# Altium footprint library DBLib.PcbLib: 92 footprints (part 3 of 6)
Each footprint in its own frame and in the unit in brackets; x right, y up, seen from the top. Pads: shape width x height; smd on the part's side, far side on the other; paste and mask are expansions set on the pad; w line width, h text height; cw(c..) or ccw(c..) is an arc to the next point about the centre after c.
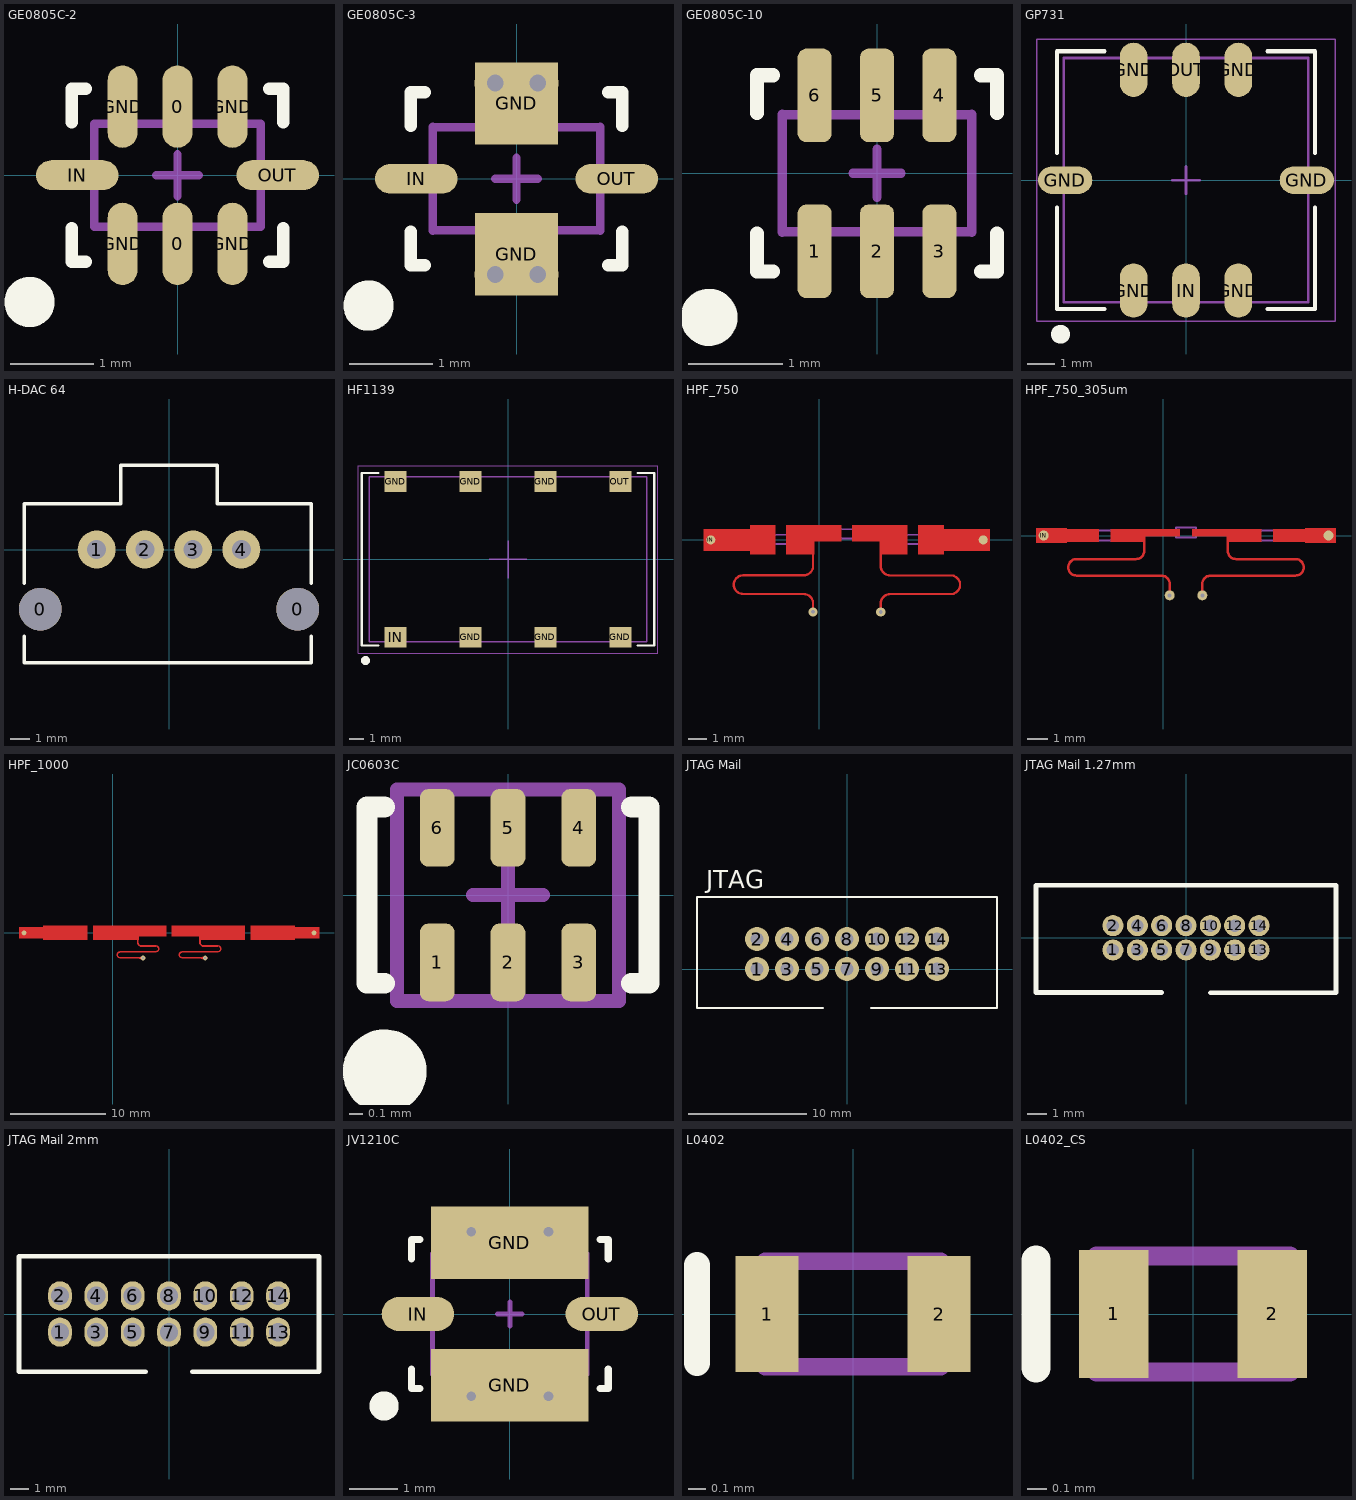
[diagram p2: the footprints below, top view; thin cyan lines are the x and y axes]

## GE0805C-2 [mm] "Low Pass Filter"
height 0.94
pads (8):
  oval 0.36x0.99 smd: 0(0,-0.825) 0(0,0.825) GND(-0.66,-0.825) GND(-0.66,0.825) GND(0.66,-0.825) GND(0.66,0.825)
  oval 0.99x0.36 smd: IN(-1.205,0) OUT(1.205,0)
Top Overlay:
  circle w0.35: c-1.778,-1.524 r0.127
  lines w0.15: -1.27,-0.638 -1.27,-1.038 -1.101,-1.038 ; -1.27,0.638 -1.27,1.038 -1.101,1.038 ; 1.101,-1.038 1.27,-1.038 1.27,-0.638 ; 1.101,1.038 1.27,1.038 1.27,0.638
Mechanical 1:
  lines w0.1: -0.254,0 0.254,0 ; 0,-0.254 0,0.254 ; -1,-0.62 1,-0.62 1,0.62 -1,0.62 -1,-0.62
3D body "User Library-Balun2450FB15L0001.step": height 0.8, standoff 0, extent -1,-0.625 1,0.625

## GE0805C-3 [mm] "Bandpass Filter"
height 0.94
pads (4):
  rect 1x0.99 smd: GND(0,-0.905) GND(0,0.905)
  oval 0.99x0.36 smd: IN(-1.205,0) OUT(1.205,0)
via -0.254,1.15 diameter 0.5 hole 0.2
via 0.254,1.15 diameter 0.5 hole 0.2
via -0.254,-1.15 diameter 0.5 hole 0.2
via 0.254,-1.15 diameter 0.5 hole 0.2
Top Overlay:
  circle w0.35: c-1.778,-1.524 r0.127
  lines w0.15: -1.27,-0.638 -1.27,-1.038 -1.101,-1.038 ; -1.27,0.638 -1.27,1.038 -1.101,1.038 ; 1.101,-1.038 1.27,-1.038 1.27,-0.638 ; 1.101,1.038 1.27,1.038 1.27,0.638
Mechanical 1:
  lines w0.1: -1.005,-0.625 -1.005,0.625 ; -1.005,-0.62 1,-0.62 ; -1.005,0.62 1,0.62 ; -0.254,0 0.254,0 ; 0,-0.254 0,0.254 ; 1.005,-0.625 1.005,0.625
3D body "User Library-3600BP15M600.step": height 0.93, standoff -0.03, extent -1.001,-0.626 1.001,0.626

## GE0805C-10 [mm] "Diplexer"
height 0.94
pads (6):
  rrect50% 0.36x0.99 smd: 1(-0.66,-0.825) 2(0,-0.825) 3(0.66,-0.825) 4(0.66,0.825) 5(0,0.825) 6(-0.66,0.825)
Top Overlay:
  circle w0.35: c-1.778,-1.524 r0.127
  lines w0.15: -1.27,-0.638 -1.27,-1.038 -1.101,-1.038 ; -1.27,0.638 -1.27,1.038 -1.101,1.038 ; 1.101,-1.038 1.27,-1.038 1.27,-0.638 ; 1.101,1.038 1.27,1.038 1.27,0.638
Mechanical 1:
  lines w0.1: -1.005,-0.625 -1.005,0.625 ; -1.005,-0.62 1,-0.62 ; -1.005,0.62 1,0.62 ; -0.254,0 0.254,0 ; 0,-0.254 0,0.254 ; 1.005,-0.625 1.005,0.625
3D body "User Library-Balun2450FB15L0001.step": height 0.8, standoff 0, extent -1,-0.625 1,0.625

## GP731 [mm] "Low Pass Filter"
height 2.54
pads (8):
  oval 2x1.02 smd: GND(-4.451,0) GND(4.451,0)
  oval 1.02x2 smd: GND(-1.93,-4.065) GND(-1.93,4.065) GND(1.93,-4.065) GND(1.93,4.065) IN(0,-4.065) OUT(0,4.065)
Top Overlay:
  circle w0.35: c-4.625,-5.675 r0.175
  lines w0.15: -4.75,-1 -4.75,-4.75 -3,-4.75 ; -4.75,1 -4.75,4.75 -3,4.75 ; 3,-4.75 4.75,-4.75 4.75,-1 ; 3,4.75 4.75,4.75 4.75,1
Mechanical 1:
  lines w0.05: -5.5,-5.2 -5.5,5.2 5.5,5.2 5.5,-5.2 -5.5,-5.2
  lines w0.1: -0.5,0 0.5,0 ; 0,-0.5 0,0.5 ; -4.5,-4.5 -4.5,4.5 4.5,4.5 4.5,-4.5 -4.5,-4.5
3D body "User Library-RBP-275+.step": height 2.54, standoff 0, extent -4.455,-4.455 4.455,4.465

## H-DAC 64 [mm]
height 25
pads (6):
  round 2.25 hole 2.25 unplated: 0(-6.78,-3.14) 0(6.78,-3.14)
  round 2 hole 1: 1(-3.81,0) 2(-1.27,0) 3(1.27,0) 4(3.81,0)
Top Overlay:
  lines w0.178: -7.62,-4.572 -7.62,-5.969 7.493,-5.969 7.493,-4.572 ; -7.62,-1.778 -7.62,0.032 -7.62,2.413 -2.54,2.413 -2.54,4.445 2.54,4.445 2.54,2.413 7.493,2.413 7.493,-1.778
3D body "311010040.stp": height 22.07, standoff -5.07, extent -8.098,-5.721 8.098,7.239

## HF1139 [mm] "Low Pass Filter"
height 6.86
pads (8):
  rect 1.52x1.4 smd: GND(-7.62,5.27) GND(-2.54,-5.27) GND(-2.54,5.27) GND(2.54,-5.27) GND(2.54,5.27) GND(7.62,-5.27) IN(-7.62,-5.27) OUT(7.62,5.27)
Top Overlay:
  circle w0.35: c-9.652,-6.858 r0.127
  lines w0.15: -8.763,-5.842 -9.908,-5.842 -9.908,5.842 -8.763,5.842 ; 8.763,-5.842 9.906,-5.842 ; 8.763,5.842 9.906,5.842 ; 9.908,-5.842 9.908,5.842
Mechanical 1:
  lines w0.05: -10.16,-6.35 -10.16,6.35 10.16,6.35 10.16,-6.35 -10.16,-6.35
  lines w0.1: -1.27,0 1.27,0 ; 0,-1.27 0,1.27 ; -9.398,-5.588 -9.398,5.588 9.398,5.588 9.398,-5.588 -9.398,-5.588
3D body: height 1, standoff 0, extent -9.398,-5.588 9.398,5.588
3D body: height 6.86, standoff 1, extent -8.89,-5.08 8.89,5.08

## HPF_750 [mm] "stripline HPF"
pads (2):
  round 0.5 smd: IN(-5.969,0) OUT(9.017,0)
via -0.342,-3.959 diameter 0.5 hole 0.2
via 3.381,-3.964 diameter 0.5 hole 0.2
Top Layer:
  region: 3.318,-0.797 3.318,0.797 4.846,0.797 4.846,-0.797
  region: 1.818,-0.067 3.318,-0.067 3.318,0.797 1.818,0.797
  region: -6.35,-0.59 -3.81,-0.59 -3.81,0.59 -6.35,0.59
  region: -3.81,-0.797 -3.81,0.797 -2.409,0.797 -2.409,-0.797
  region: -1.809,-0.797 -1.809,0.797 -0.282,0.797 -0.282,-0.797
  region: -0.282,-0.067 -0.282,0.797 1.218,0.797 1.218,-0.067
  region: 5.446,-0.797 5.446,0.797 6.846,0.797 6.846,-0.797
  region: 6.846,-0.59 9.386,-0.59 9.386,0.59 6.846,0.59
  lines w0.127: -0.342,-3.959 -0.342,-3.489 ccw(c-0.856,-3.489) -0.856,-2.975 -4.19,-2.975 cw(c-4.19,-2.462) -4.704,-2.462 cw(c-4.19,-2.462) -4.19,-1.948 -0.856,-1.948 ccw(c-0.856,-1.435) -0.342,-1.435 -0.342,-0.8 ; 3.381,-3.964 3.381,-3.494 cw(c3.894,-3.494) 3.894,-2.98 7.229,-2.98 ccw(c7.229,-2.467) 7.742,-2.467 ccw(c7.229,-2.467) 7.229,-1.953 3.894,-1.953 cw(c3.894,-1.44) 3.381,-1.44 3.381,-0.805
Top Solder:
  region: -6.526,2.174 9.574,2.174 9.614,2.174 9.687,2.144 9.744,2.087 9.774,2.014 9.774,1.974 9.774,-4.626 9.774,-4.666 9.743,-4.739 9.687,-4.796 9.614,-4.826 9.574,-4.826 -6.526,-4.826 -6.566,-4.826 -6.639,-4.796 -6.696,-4.739 -6.726,-4.666 -6.726,-4.626 -6.726,1.974 -6.726,2.014 -6.696,2.087 -6.639,2.143 -6.566,2.174
Mechanical 1:
  lines w0.1: -2.582,-0.217 -2.582,0.283 -1.582,0.283 -1.582,-0.217 -2.582,-0.217 ; 1.018,0.083 1.018,0.583 2.018,0.583 2.018,0.083 1.018,0.083 ; 4.618,-0.217 4.618,0.283 5.618,0.283 5.618,-0.217 4.618,-0.217
3D body "0402-SMD CAPACITOR.step": height 0.49, standoff -0.01, extent 4.618,-0.217 5.618,0.283
3D body "0402-SMD CAPACITOR.step": height 0.49, standoff -0.01, extent 1.018,0.083 2.018,0.583
3D body "0402-SMD CAPACITOR.step": height 0.49, standoff -0.01, extent -2.582,-0.217 -1.582,0.283

## HPF_750_305um [mm] "stripline HPF"
pads (4):
  round 0.5 hole 0.2: GND(0.326,-2.986) GND(1.957,-2.986)
  round 0.5 smd: IN(-5.969,0) OUT(8.255,0)
Top Layer:
  region: 7.109,-0.355 8.634,-0.355 8.634,0.355 7.109,0.355
  region: 5.499,-0.315 7.109,-0.315 7.109,0.315 5.499,0.315
  region: 3.164,-0.315 3.164,0.315 4.899,0.315 4.899,-0.315
  region: 1.441,-0.041 3.164,-0.041 3.164,0.315 1.441,0.315
  region: -0.882,-0.041 0.841,-0.041 0.841,0.315 -0.882,0.315
  region: -2.616,-0.315 -2.616,0.315 -0.882,0.315 -0.882,-0.315
  region: -4.826,-0.315 -3.216,-0.315 -3.216,0.315 -4.826,0.315
  region: -6.351,-0.355 -6.351,0.355 -4.826,0.355 -4.826,-0.355
  lines w0.125: -4.32,-1.174 ccw(c-4.32,-1.587) -4.733,-1.587 ; -4.318,-1.174 -1.357,-1.174 ccw(c-1.357,-0.762) -0.944,-0.762 -0.944,-0.315 ; 0.326,-2.986 0.326,-2.667 0.326,-2.412 ccw(c-0.087,-2.412) -0.087,-1.999 -4.32,-1.999 cw(c-4.32,-1.587) -4.733,-1.587 ; 1.957,-2.986 1.957,-2.667 1.957,-2.412 cw(c2.369,-2.412) 2.369,-1.999 6.603,-1.999 ccw(c6.603,-1.587) 7.016,-1.587 ; 3.227,-0.315 3.227,-0.762 ccw(c3.639,-0.762) 3.639,-1.174 6.601,-1.174 ; 6.603,-1.174 cw(c6.603,-1.587) 7.016,-1.587 ; -4.733,-1.587 -4.733,-1.587 ; 7.016,-1.587 7.016,-1.587
Mechanical 1:
  lines w0.1: -3.42,-0.243 -3.42,0.257 -2.42,0.257 -2.42,-0.243 -3.42,-0.243 ; 0.638,-0.105 0.638,0.395 1.638,0.395 1.638,-0.105 0.638,-0.105 ; 4.693,-0.242 4.693,0.258 5.693,0.258 5.693,-0.242 4.693,-0.242
3D body "0402-SMD CAPACITOR.step": height 0.49, standoff -0.01, extent 4.693,-0.242 5.693,0.258
3D body "0402-SMD CAPACITOR.step": height 0.49, standoff -0.01, extent 0.638,-0.105 1.638,0.395
3D body "0402-SMD CAPACITOR.step": height 0.49, standoff -0.01, extent -3.42,-0.243 -2.42,0.257

## HPF_1000 [mm] "stripline HPF"
pads (2):
  round 0.5 smd: IN(-9.271,0) OUT(21.082,0)
via 3.191,-2.619 diameter 0.5 hole 0.2
via 9.689,-2.619 diameter 0.5 hole 0.2
Top Layer:
  region: -9.797,-0.575 -7.257,-0.575 -7.257,0.606 -9.797,0.606
  region: -7.257,-0.73 -7.257,0.761 -2.633,0.761 -2.633,-0.73
  region: -2.033,-0.73 2.718,-0.73 2.718,0.761 -2.033,0.761
  region: 2.718,-0.352 2.718,0.761 5.603,0.761 5.603,-0.352
  region: 6.203,-0.352 9.089,-0.352 9.089,0.761 6.203,0.761
  region: 9.089,-0.73 13.84,-0.73 13.84,0.761 9.089,0.761
  region: 19.063,-0.575 21.603,-0.575 21.603,0.606 19.063,0.606
  region: 14.44,-0.73 19.063,-0.73 19.063,0.761 14.44,0.761
  region: 313 vertices and 0 holes, not listed, extent 0.434,-2.675 4.873,-0.612
  region: 313 vertices and 0 holes, not listed, extent 6.933,-2.675 11.372,-0.612
  region: 9.297,-2.555 9.318,-2.554 9.339,-2.551 9.36,-2.545 9.381,-2.538 9.403,-2.528 9.424,-2.515 9.445,-2.501 9.467,-2.484 9.489,-2.465 9.511,-2.444 9.511,-2.794 9.489,-2.773 9.467,-2.754 9.445,-2.737 9.424,-2.723 9.403,-2.71 9.381,-2.7 9.36,-2.692 9.339,-2.687 9.318,-2.684 9.297,-2.682
  region: 2.799,-2.555 2.82,-2.554 2.841,-2.551 2.862,-2.545 2.883,-2.538 2.904,-2.528 2.926,-2.515 2.947,-2.501 2.969,-2.484 2.991,-2.465 3.012,-2.444 3.012,-2.794 2.991,-2.773 2.969,-2.754 2.947,-2.737 2.926,-2.723 2.904,-2.71 2.883,-2.7 2.862,-2.692 2.841,-2.687 2.82,-2.684 2.799,-2.682
Top Solder:
  region: -9.271,2.54 21.082,2.54 21.132,2.54 21.226,2.502 21.297,2.43 21.336,2.337 21.336,2.286 21.336,-3.556 21.336,-3.607 21.297,-3.7 21.226,-3.771 21.133,-3.81 21.082,-3.81 -9.271,-3.81 -9.322,-3.81 -9.415,-3.771 -9.486,-3.7 -9.525,-3.607 -9.525,-3.556 -9.525,2.286 -9.525,2.337 -9.486,2.43 -9.415,2.501 -9.322,2.54

## JC0603C [mm] "Diplexer"
height 0.61
pads (6):
  rrect50% 0.25x0.56 smd: 1(-0.51,-0.485) 2(0,-0.485) 3(0.51,-0.485) 4(0.51,0.485) 5(0,0.485) 6(-0.51,0.485)
Top Overlay:
  circle w0.35: c-0.889,-1.27 r0.127
  lines w0.15: -0.889,-0.635 -1.016,-0.635 -1.016,0.635 -0.889,0.635 ; 0.889,-0.635 1.016,-0.635 1.016,0.635 0.889,0.635
Mechanical 1:
  lines w0.1: -0.254,0 0.254,0 ; 0,-0.254 0,0.254 ; -0.8,-0.762 -0.8,0.762 0.8,0.762 0.8,-0.762 -0.8,-0.762
3D body "User Library-DCW-30-272+ (JC0603C).step": height 0.62, standoff -0.01, extent -0.8,-0.405 0.8,0.405

## JTAG Mail [mil]
height 114.17
pads (14):
  round 80 hole 42: 1(-300,0) 2(-300,100) 3(-200,0) 4(-200,100) 5(-100,0) 6(-100,100) 7(0,0) 8(0,100) 9(100,0) 10(100,100) 11(200,0) 12(200,100) 13(300,0) 14(300,100)
Top Overlay:
  lines w7.87: -80,-130 -500,-130 -500,240 500,240 500,-130 80,-130
  text "JTAG" at -470,270 h60
3D body "User Library-IDC Socket Male 14pin Straight THT Goldplated 2_54mm.step": height 363.39, standoff -124.8, extent -499.6,-117.32 499.61,231.11

## JTAG Mail 1.27mm [mm]
height 2.9
pads (14):
  round 1.1 hole 0.65: 1(-3.81,-0.635) 2(-3.81,0.635) 3(-2.54,-0.635) 4(-2.54,0.635) 5(-1.27,-0.635) 6(-1.27,0.635) 7(0,-0.635) 8(0,0.635) 9(1.27,-0.635) 10(1.27,0.635) 11(2.54,-0.635) 12(2.54,0.635) 13(3.81,-0.635) 14(3.81,0.635)
Top Overlay:
  lines w0.254: -1.27,-2.855 -7.823,-2.855 -7.823,2.743 7.823,2.743 7.823,-2.866 1.27,-2.866
3D body "User Library-CONB127P-2R-20W_TH.step": height 5.4, standoff -2.1, extent -7.595,-2.65 7.595,2.55

## JTAG Mail 2mm [mm] "2.00mm Pitch, Milli-Grid PCB Header, Dual Row, Vertical, Through Hole, Shrouded, 14  Circuits"
height 2.9
pads (14):
  oval 1.3x1.6 hole 1: 1(-6,-1) 2(-6,1) 3(-4,-1) 4(-4,1) 5(-2,-1) 6(-2,1) 7(0,-1) 8(0,1) 9(2,-1) 10(2,1) 11(4,-1) 12(4,1) 13(6,-1) 14(6,1)
Top Overlay:
  lines w0.254: -1.27,-3.175 -8.255,-3.175 -8.255,3.175 8.255,3.175 8.255,-3.175 1.27,-3.175
3D body "878311421.stp": height 6.45, standoff -2.45, extent -8.325,-3.15 8.325,3.15

## JV1210C [mm] "Bandpass Filter"
height 1.5
pads (4):
  rect 3.25x1.5 smd: GND(0,-1.475) GND(0,1.475)
  oval 1.5x0.7 smd: IN(-1.9,0) OUT(1.9,0)
via 0.8,1.7 diameter 0.5 hole 0.2
via -0.8,1.7 diameter 0.5 hole 0.2
via 0.8,-1.7 diameter 0.5 hole 0.2
via -0.8,-1.7 diameter 0.5 hole 0.2
Top Overlay:
  circle w0.35: c-2.6,-1.9 r0.127
  lines w0.15: -2.032,-1.138 -2.032,-1.538 -1.863,-1.538 ; -2.032,1.138 -2.032,1.538 -1.863,1.538 ; 1.863,-1.538 2.032,-1.538 2.032,-1.138 ; 1.863,1.538 2.032,1.538 2.032,1.138
Mechanical 1:
  lines w0.1: -0.254,0 0.254,0 ; 0,-0.254 0,0.254 ; -1.6,-1.25 1.6,-1.25 1.6,1.25 -1.6,1.25 -1.6,-1.25
3D body "User Library-CAPC3225X13.step": height 1.3, standoff 0, extent -1.6,-1.25 1.6,1.25

## L0402 [mm]
height 1.3
pads (2):
  rect 0.36x0.66 smd: 1(-0.49,0) 2(0.49,0)
Top Overlay:
  lines w0.15: -0.889,-0.279 -0.889,0.279
Mechanical 1:
  lines w0.1: -0.5,-0.3 -0.5,0.3 0.5,0.3 0.5,-0.3 -0.5,-0.3
3D body "Coilcraft-0402DF.step": height 0.66, standoff 0, extent -0.559,-0.325 0.559,0.335

## L0402_CS [mm]
height 1.3
pads (2):
  rect 0.36x0.66 smd: 1(-0.41,0) 2(0.41,0)
Top Overlay:
  lines w0.15: -0.813,-0.279 -0.813,0.279
Mechanical 1:
  lines w0.1: -0.5,-0.3 -0.5,0.3 0.5,0.3 0.5,-0.3 -0.5,-0.3
3D body "Coilcraft-0402CS.step": height 0.65, standoff -0.01, extent -0.593,-0.318 0.593,0.318